# Altium footprint library MidFlg_V1_Hwork.PcbLib: 34 footprints (part 2 of 3)
Each footprint in its own frame and in the unit in brackets; x right, y up, seen from the top. Pads: shape width x height; smd on the part's side, far side on the other; paste and mask are expansions set on the pad; w line width, h text height; cw(c..) or ccw(c..) is an arc to the next point about the centre after c.
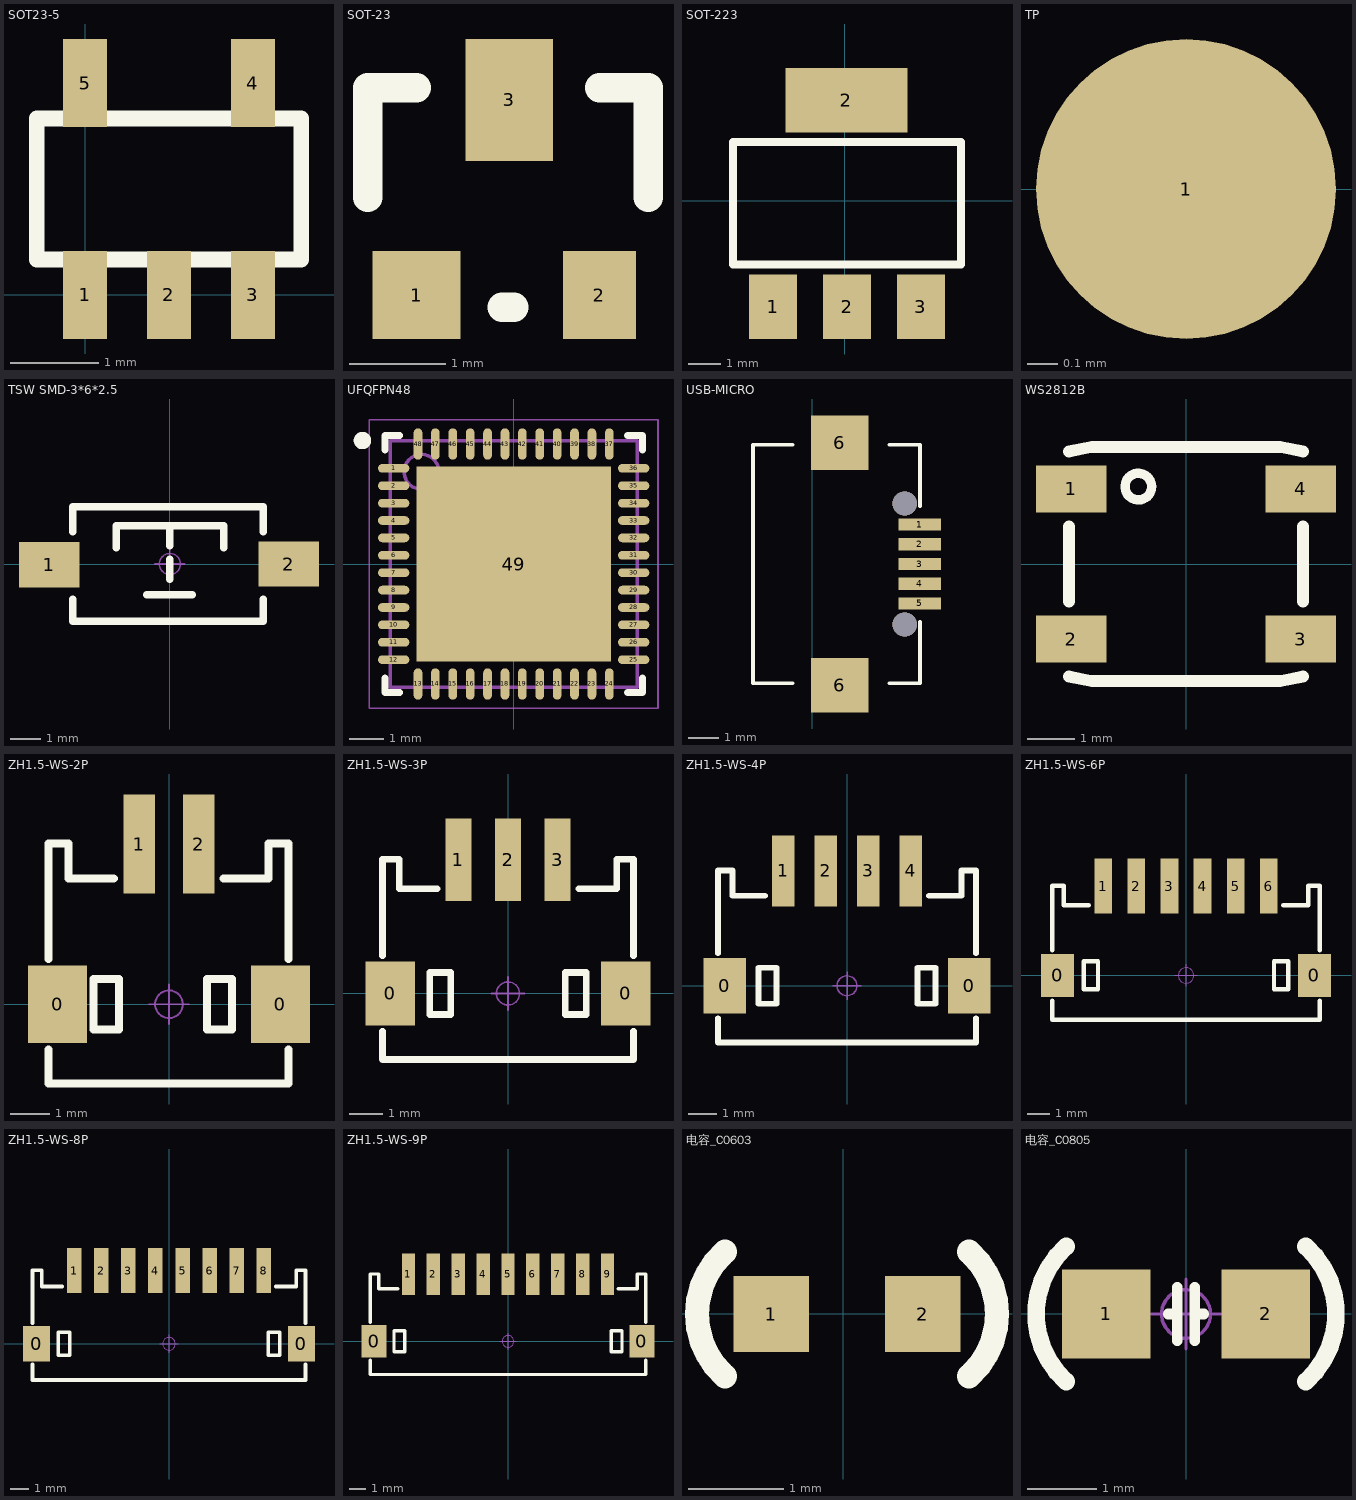
[diagram p1: the footprints below, top view; thin cyan lines are the x and y axes]

## SOT23-5 [mm]
pads (5):
  rect 0.5x1 smd: 1(0,0) 2(0.95,0) 3(1.9,0) 4(1.9,2.4) 5(0,2.4)
Top Overlay:
  lines w0.178: -0.55,0.4 -0.55,2 2.45,2 2.45,0.4 -0.55,0.4
3D body "User Library-SOT23-5.STEP": height 1.09, standoff -0.01, extent -0.5,-0.201 2.399,2.599

## SOT-23 [mil] "封装库来自淘宝卖家 ID：黄晶宝石"
pads (3):
  rect 36x36 smd: 1(47.76,-120.28)
  rect 30x36 smd: 2(122.75,-120.28)
  rect 36x50 smd: 3(85.75,-40.28)
Top Overlay:
  lines w12: 27.75,-80.28 27.75,-35.28 47.76,-35.28 ; 82.75,-125.28 87.75,-125.28 ; 122.75,-35.28 142.75,-35.28 142.75,-80.28
3D body "SOT-23-3.STEP": height 47.24, standoff 0, extent 25.13,-131.02 139.3,-20.78

## SOT-223 [mil] "封装库来自淘宝卖家 ID：黄晶宝石"
pads (4):
  rect 59x79 smd: 1(-88,-130) 2(2.55,-130) 3(93.1,-130)
  rect 150x79 smd: 2(1.88,123.54)
Top Overlay:
  lines w10: -137.45,-78 142.55,-78 142.55,72 -137.45,72 -137.45,-78
3D body "SOT-223_MP04A.STEP": height 66.93, standoff 0, extent -126.41,-138.72 129.5,135.3

## TP [mm] "封装库来自淘宝卖家 ID：黄晶宝石"
pads (1):
  round 1 smd: 1(-1.27,0)

## TSW SMD-3*6*2.5 [mm] "3*6*2.5mm"
pads (2):
  rect 2x1.5 smd: 1(-3.996,-0.02) 2(3.937,0)
Top Overlay:
  lines w0.254: -3.212,-1.168 -3.212,-1.9 3.088,-1.9 3.088,-1.168 ; -3.212,1.067 -3.212,1.9 3.088,1.9 3.088,1.067 ; -1.778,0.533 -1.778,1.27 1.778,1.27 1.778,0.533 ; -0.762,-1.016 0.737,-1.016 ; 0,-0.508 0,0.152 ; 0,0.61 0,1.27
Mechanical 15:
  circle w0.05: c0,0 r0.35
  lines w0.05: -0.5,0 0.5,0 ; 0,-0.5 0,0.5
3D body "TSW SMD-3x6x2.5.STEP": height 2.59, standoff -0.03, extent -4,-1.877 4,1.623

## UFQFPN48 [mm] "QFN, 48-Leads, Body 7.1x7.1mm, Pitch 0.5mm, Thermal Pad 5.6x5.6mm, IPC Medium Density"
height 0.6
pads (49):
  oval 0.9x0.25 smd: 1(-3.45,2.75) 2(-3.45,2.25) 3(-3.45,1.75) 4(-3.45,1.25) 5(-3.45,0.75) 6(-3.45,0.25) 7(-3.45,-0.25) 8(-3.45,-0.75) 9(-3.45,-1.25) 10(-3.45,-1.75) 11(-3.45,-2.25) 12(-3.45,-2.75) 25(3.45,-2.75) 26(3.45,-2.25) 27(3.45,-1.75) 28(3.45,-1.25) 29(3.45,-0.75) 30(3.45,-0.25) 31(3.45,0.25) 32(3.45,0.75) 33(3.45,1.25) 34(3.45,1.75) 35(3.45,2.25) 36(3.45,2.75)
  oval 0.25x0.9 smd: 13(-2.75,-3.45) 14(-2.25,-3.45) 15(-1.75,-3.45) 16(-1.25,-3.45) 17(-0.75,-3.45) 18(-0.25,-3.45) 19(0.25,-3.45) 20(0.75,-3.45) 21(1.25,-3.45) 22(1.75,-3.45) 23(2.25,-3.45) 24(2.75,-3.45) 37(2.75,3.45) 38(2.25,3.45) 39(1.75,3.45) 40(1.25,3.45) 41(0.75,3.45) 42(0.25,3.45) 43(-0.25,3.45) 44(-0.75,3.45) 45(-1.25,3.45) 46(-1.75,3.45) 47(-2.25,3.45) 48(-2.75,3.45)
  rect 5.6x5.6 smd: 49(0,0)
Top Overlay:
  circle w0.25: c-4.35,3.55 r0.125
  lines w0.2: -3.7,-3.275 -3.7,-3.7 -3.275,-3.7 ; -3.7,3.275 -3.7,3.7 -3.275,3.7 ; 3.275,-3.7 3.7,-3.7 3.7,-3.275 ; 3.275,3.7 3.7,3.7 3.7,3.275
Mechanical 13:
  circle w0.1: c-2.65,2.65 r0.5
  lines w0.1: -3.55,-3.55 3.55,-3.55 3.55,3.55 -3.55,3.55 -3.55,-3.55
Mechanical 15:
  lines w0.05: -4.15,-4.15 4.15,-4.15 4.15,4.15 -4.15,4.15 -4.15,-4.15
3D body "QFN-48-1EP_7x7mm_P0.5mm_EP5.3x5.3mm.step": height 1.1, standoff 0, extent -3.505,-3.505 3.495,3.495

## USB-MICRO [mm]
pads (7):
  rect 1.4x0.4 smd: 1(3.544,13.803) 2(3.544,13.153) 3(3.544,12.503) 4(3.544,11.853) 5(3.544,11.203)
  rect 1.9x1.8 smd: 6(0.894,8.503) 6(0.894,16.503)
via 3.044,14.503 diameter 0.8 hole 0.8
via 3.044,10.503 diameter 0.8 hole 0.8
Top Overlay:
  lines w0.127: -1.964,8.566 -0.656,8.566 ; -1.964,8.603 -1.964,16.403 ; -1.964,16.44 -0.656,16.44 ; 2.544,8.566 3.544,8.566 3.544,10.598 ; 2.544,16.44 3.544,16.44 ; 3.544,14.408 3.544,16.403
3D body "User Library-Micro USB.STEP": height 2.72, standoff -0.22, extent -1.861,8.513 3.569,16.493

## WS2812B [mm]
pads (4):
  rect 1.5x1 smd: 1(-2.45,1.6) 2(-2.45,-1.6) 3(2.45,-1.6) 4(2.45,1.6)
Top Overlay:
  circle w0.2: c-1.016,1.651 r0.284
  lines w0.254: -2.5,-2.4 -2,-2.5 2,-2.5 2.5,-2.4 ; -2.5,-0.8 -2.5,0.8 ; 2.5,-0.8 2.5,0.8 ; 2.5,2.4 2,2.5 -2,2.5 ; -2,2.5 -2.5,2.4 -2,2.5
3D body "User Library-ws2812B-1.STEP": height 1.54, standoff -0.03, extent -2.7,-2.5 2.7,2.5

## ZH1.5-WS-2P [mm] "长：6.1mm，宽：2.5mm，高：3.7mm"
pads (4):
  rect 1.5x1.95 smd: 0(-2.818,0) 0(2.818,0)
  rect 0.8x2.5 smd: 1(-0.75,4.05) 2(0.75,4.05)
Top Overlay:
  lines w0.203: -3.048,-1.143 -3.05,-1.143 -3.05,-2 3.026,-2 3.026,-1.143 3.024,-1.143 ; -3.048,1.143 -3.05,1.143 -3.05,4.064 -2.54,4.064 -2.54,3.175 -1.397,3.175 ; 1.373,3.175 2.516,3.175 2.516,4.064 3.026,4.064 3.026,1.143 3.024,1.143 ; -1.905,-0.635 -1.905,0.635 -1.27,0.635 -1.27,-0.635 -1.905,-0.635 ; 0.961,-0.635 1.596,-0.635 1.596,0.635 0.961,0.635 0.961,-0.635
Mechanical 15:
  circle w0.05: c0,0 r0.35
  lines w0.05: -0.5,0 0.5,0 ; 0,-0.5 0,0.5
3D body "ZH1.5-WS-2P.STEP": height 3.75, standoff 0, extent -3.05,-2 3.05,4.6

## ZH1.5-WS-3P [mm] "长：7.6mm，宽：6.0mm，高：3.7mm"
pads (5):
  rect 1.5x1.95 smd: 0(-3.568,0) 0(3.568,0)
  rect 0.8x2.5 smd: 1(-1.5,4.05) 2(0,4.05) 3(1.5,4.05)
Top Overlay:
  lines w0.203: -3.798,-2 -3.8,-2 ; -3.798,-1.143 -3.8,-1.143 -3.8,-2 ; -3.798,1.143 -3.8,1.143 -3.8,4.064 -3.29,4.064 -3.29,3.175 -2.147,3.175 ; 2.147,3.175 3.29,3.175 3.29,4.064 3.8,4.064 3.8,1.143 3.798,1.143 ; 3.798,-2 3.8,-2 ; 3.798,-1.143 3.8,-1.143 3.8,-2 ; -3.8,-2 3.8,-2 ; 3.8,-2 3.8,-2 ; -2.37,-0.635 -2.37,0.635 -1.735,0.635 -1.735,-0.635 -2.37,-0.635 ; 1.735,-0.635 2.37,-0.635 2.37,0.635 1.735,0.635 1.735,-0.635
Mechanical 15:
  circle w0.05: c0,0 r0.35
  lines w0.05: -0.5,0 0.5,0 ; 0,-0.5 0,0.5
3D body "ZH1.5-WS-3P.STEP": height 3.75, standoff 0, extent -3.8,-2 3.8,4.6

## ZH1.5-WS-4P [mm] "长：9.1mm，宽：6.0mm，高：3.7mm"
pads (6):
  rect 1.5x1.95 smd: 0(-4.318,0) 0(4.318,0)
  rect 0.8x2.5 smd: 1(-2.25,4.05) 2(-0.75,4.05) 3(0.75,4.05) 4(2.25,4.05)
Top Overlay:
  lines w0.203: -4.548,-2 -4.55,-2 ; -4.548,-1.143 -4.55,-1.143 -4.55,-2 ; -4.548,1.143 -4.55,1.143 -4.55,4.064 -4.04,4.064 -4.04,3.175 -2.897,3.175 ; 2.897,3.175 4.04,3.175 4.04,4.064 4.55,4.064 4.55,1.143 4.548,1.143 ; 4.548,-1.143 4.55,-1.143 4.55,-2 4.548,-2 -4.55,-2 ; -3.12,-0.635 -2.485,-0.635 -2.485,0.635 -3.12,0.635 -3.12,-0.635 ; 2.485,-0.635 3.12,-0.635 3.12,0.635 2.485,0.635 2.485,-0.635
Mechanical 15:
  circle w0.05: c0,0 r0.35
  lines w0.05: -0.5,0 0.5,0 ; 0,-0.5 0,0.5
3D body "ZH1.5-WS-4P.STEP": height 3.75, standoff 0, extent -4.55,-2 4.55,4.6

## ZH1.5-WS-6P [mm] "长：12.1mm，宽：6.0mm，高：3.7mm"
pads (8):
  rect 1.5x1.95 smd: 0(-5.818,0) 0(5.818,0)
  rect 0.8x2.5 smd: 1(-3.75,4.05) 2(-2.25,4.05) 3(-0.75,4.05) 4(0.75,4.05) 5(2.25,4.05) 6(3.75,4.05)
Top Overlay:
  lines w0.203: -6.048,-1.143 -6.05,-1.143 -6.05,-2 -6.048,-2 6.05,-2 ; -6.048,1.143 -6.05,1.143 -6.05,4.064 -5.54,4.064 -5.54,3.175 -4.397,3.175 ; 4.397,3.175 5.54,3.175 5.54,4.064 6.05,4.064 6.05,1.143 6.048,1.143 ; 6.048,-2 6.05,-2 ; 6.048,-1.143 6.05,-1.143 6.05,-2 ; -4.62,-0.635 -4.62,0.635 -3.985,0.635 -3.985,-0.635 -4.62,-0.635 ; 3.985,-0.635 4.62,-0.635 4.62,0.635 3.985,0.635 3.985,-0.635
Mechanical 15:
  circle w0.05: c0,0 r0.35
  lines w0.05: -0.5,0 0.5,0 ; 0,-0.5 0,0.5
3D body "ZH1.5-WS-6P.STEP": height 3.75, standoff 0, extent -6.05,-2 6.05,4.6

## ZH1.5-WS-8P [mm] "长：15.1mm，宽：6.0mm，高：3.7mm"
pads (10):
  rect 1.5x1.95 smd: 0(-7.318,0) 0(7.318,0)
  rect 0.8x2.5 smd: 1(-5.25,4.05) 2(-3.75,4.05) 3(-2.25,4.05) 4(-0.75,4.05) 5(0.75,4.05) 6(2.25,4.05) 7(3.75,4.05) 8(5.25,4.05)
Top Overlay:
  lines w0.203: -7.548,-2 -7.55,-2 ; -7.548,-1.143 -7.55,-1.143 -7.55,-2 ; -7.548,1.143 -7.55,1.143 -7.55,4.064 -7.04,4.064 -7.04,3.175 -5.897,3.175 ; 5.897,3.175 7.04,3.175 7.04,4.064 7.55,4.064 7.55,1.143 7.548,1.143 ; 7.548,-2 7.55,-2 ; 7.548,-1.143 7.55,-1.143 7.55,-2 ; -7.55,-2 7.55,-2 ; -6.12,-0.635 -5.485,-0.635 -5.485,0.635 -6.12,0.635 -6.12,-0.635 ; 5.485,-0.635 5.485,0.635 6.12,0.635 6.12,-0.635 5.485,-0.635
Mechanical 15:
  circle w0.05: c0,0 r0.35
  lines w0.05: -0.5,0 0.5,0 ; 0,-0.5 0,0.5
3D body "ZH1.5-WS-8P.STEP": height 3.75, standoff 0, extent -7.55,-2 7.55,4.6

## ZH1.5-WS-9P [mm] "长：16.6mm，宽：6.0mm，高：3.7mm"
pads (11):
  rect 1.5x1.95 smd: 0(-8.068,0) 0(8.068,0)
  rect 0.8x2.5 smd: 1(-6,4.05) 2(-4.5,4.05) 3(-3,4.05) 4(-1.5,4.05) 5(0,4.05) 6(1.5,4.05) 7(3,4.05) 8(4.5,4.05) 9(6,4.05)
Top Overlay:
  lines w0.203: -8.298,-1.143 -8.3,-1.143 -8.3,-2 -8.298,-2 8.298,-2 8.3,-2 8.3,-1.143 8.298,-1.143 ; -8.298,1.143 -8.3,1.143 -8.3,4.064 -7.79,4.064 -7.79,3.175 -6.647,3.175 ; 6.647,3.175 7.79,3.175 7.79,4.064 8.3,4.064 8.3,1.143 8.298,1.143 ; -6.87,-0.635 -6.87,0.635 -6.235,0.635 -6.235,-0.635 -6.87,-0.635 ; 6.235,-0.635 6.87,-0.635 6.87,0.635 6.235,0.635 6.235,-0.635
Mechanical 15:
  circle w0.05: c0,0 r0.35
  lines w0.05: -0.5,0 0.5,0 ; 0,-0.5 0,0.5
3D body "ZH1.5-WS-9P.STEP": height 3.75, standoff 0, extent -8.3,-2 8.3,4.6

## 电容_C0603 [mm]
pads (2):
  rect 0.8x0.8 smd: 1(-0.762,0) 2(0.838,0)
Top Overlay:
  lines w0.254: -1.252,-0.657 cw(c-0.662,0) -1.252,0.657 ; 1.328,-0.657 ccw(c0.738,0) 1.328,0.657
3D body "User Library-0603 SMD Capacitor.STEP": height 0.3, standoff 0, extent -0.762,-0.4 0.838,0.4

## 电容_C0805 [mil] "无极性贴片电容                                        淘宝ID:黄晶宝石"
height 19.68
pads (2):
  rect 50x50 smd: 1(-45,0) 2(45,0)
Top Overlay:
  lines w6: -10,0 -5,0 ; -5,-15 -5,15 ; 5,-15 5,15 ; 5,0 10,0
  lines w10: -67.66,-38.09 cw(c-33.47,0) -67.66,38.08 ; 67.65,-38.09 ccw(c33.46,0) 67.65,38.08
Mechanical 15:
  circle w1.97: c0,0 r13.78
  lines w1.97: -19.68,0 19.68,0 ; 0,-19.68 0,19.68
3D body "C 0805.STEP": height 20.08, standoff -0.39, extent -39.37,-24.02 39.37,24.02